# Altium footprint library ST封装.PcbLib: 1336 footprints (part 36 of 109)
Each footprint in its own frame and in the unit in brackets; x right, y up, seen from the top. Pads: shape width x height; smd on the part's side, far side on the other; paste and mask are expansions set on the pad; w line width, h text height; cw(c..) or ccw(c..) is an arc to the next point about the centre after c.
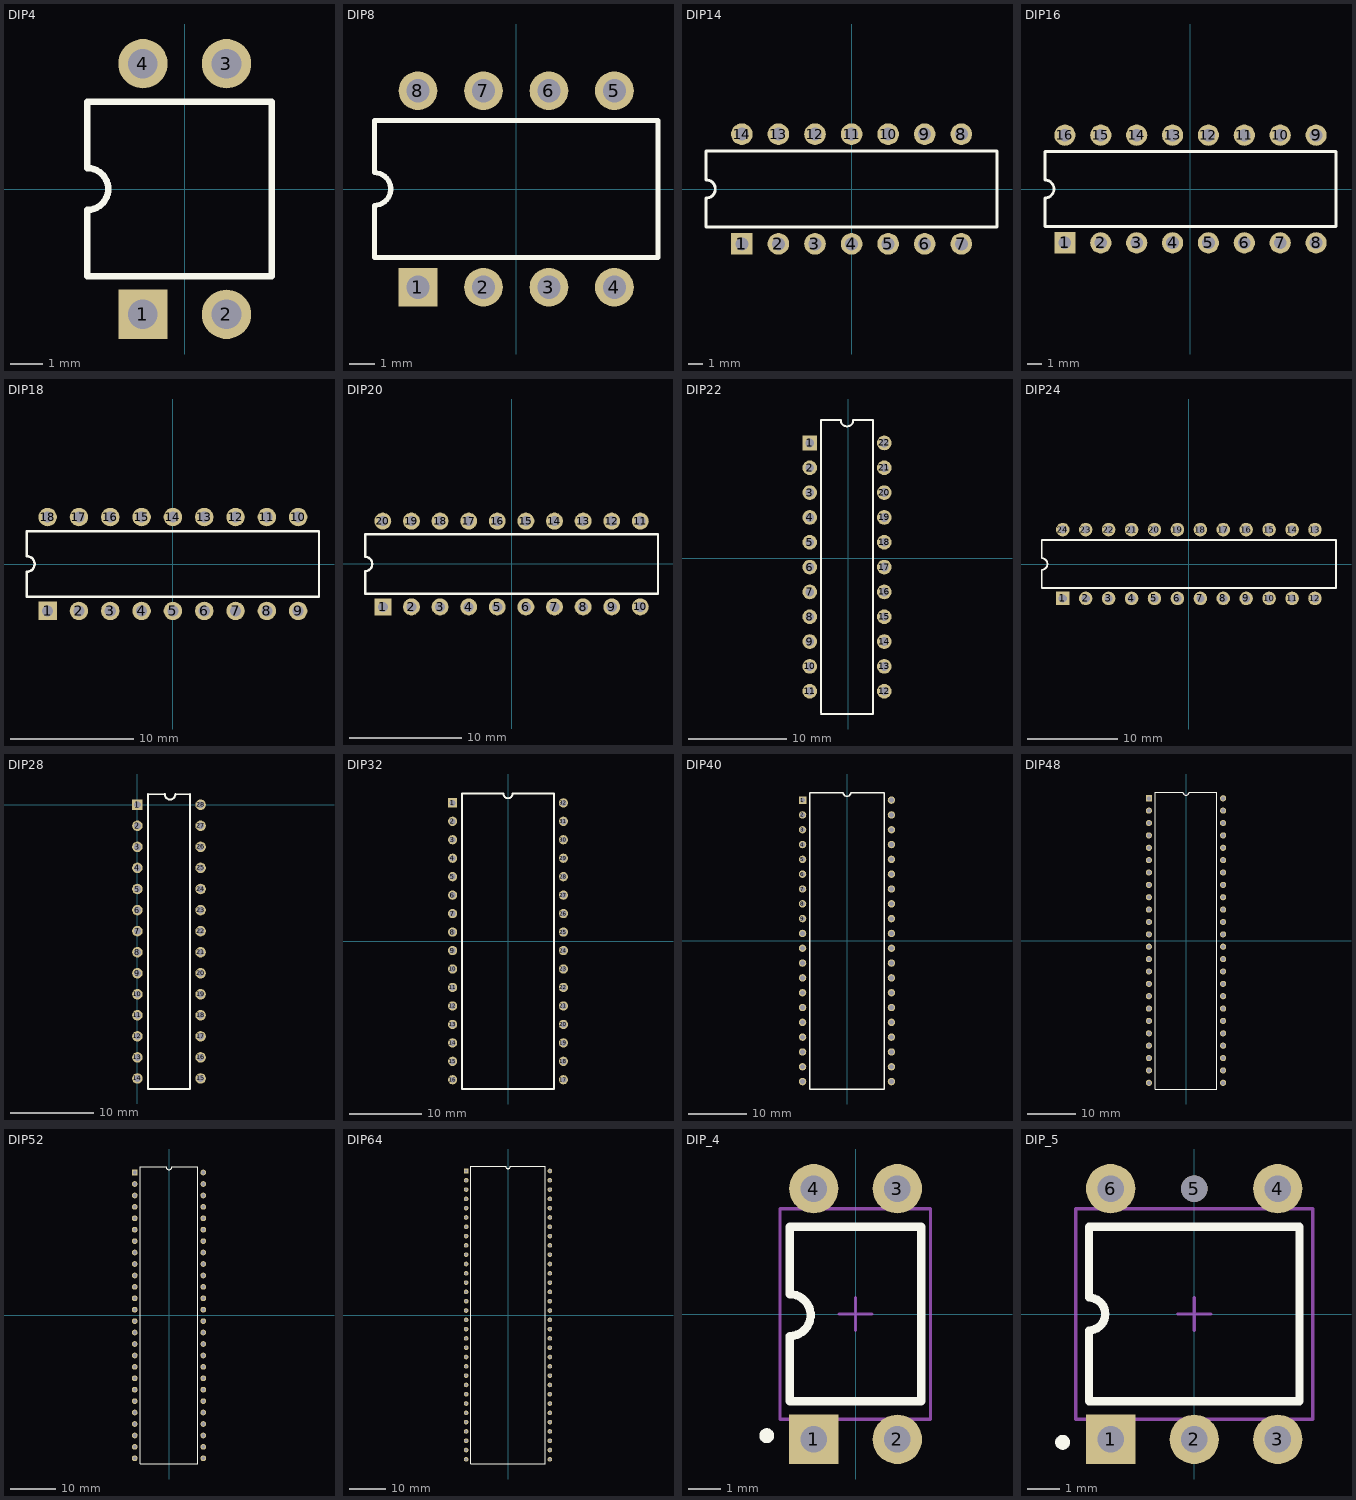
[diagram p35: the footprints below, top view; thin cyan lines are the x and y axes]

## DIP4 [mm] "DIP; 8 Leads; Row Spacing 7.62 mm; Pitch 2.54 mm"
height 5.08
pads (4):
  rect 1.5x1.5 hole 0.9: 1(-1.27,-3.81)
  round 1.5 hole 0.9: 2(1.27,-3.81) 3(1.27,3.81) 4(-1.27,3.81)
Top Overlay:
  lines w0.2: -2.96,-2.65 -2.96,-0.635 ccw(c-2.96,0) -2.96,0.635 -2.96,2.65 2.64,2.65 2.64,-2.65 -2.96,-2.65
3D body "DIP4.STEP": height 4.31, standoff -3.28, extent -2.88,-3.825 2.66,4.175

## DIP8 [mm] "DIP; 8 Leads; Row Spacing 7.62 mm; Pitch 2.54 mm"
height 5.08
pads (8):
  rect 1.5x1.5 hole 0.9: 1(-3.81,-3.81)
  round 1.5 hole 0.9: 2(-1.27,-3.81) 3(1.27,-3.81) 4(3.81,-3.81) 5(3.81,3.81) 6(1.27,3.81) 7(-1.27,3.81) 8(-3.81,3.81)
Top Overlay:
  lines w0.2: -5.5,-2.65 5.5,-2.65 5.5,2.65 -5.5,2.65 -5.5,0.635 cw(c-5.5,0) -5.5,-0.635 -5.5,-2.65
3D body "DIP8.STEP": height 4.5, standoff -3.5, extent -5.273,-3.753 5.527,4.007

## DIP14 [mm] "DIP; 14 Leads; Row Spacing 7.62 mm; Pitch 2.54 mm"
height 5.1
pads (14):
  rect 1.5x1.5 hole 0.9: 1(-7.62,-3.81)
  round 1.5 hole 0.9: 2(-5.08,-3.81) 3(-2.54,-3.81) 4(0,-3.81) 5(2.54,-3.81) 6(5.08,-3.81) 7(7.62,-3.81) 8(7.62,3.81) 9(5.08,3.81) 10(2.54,3.81) 11(0,3.81) 12(-2.54,3.81) 13(-5.08,3.81) 14(-7.62,3.81)
Top Overlay:
  lines w0.2: -10.1,-2.65 10.1,-2.65 10.1,2.65 -10.1,2.65 -10.1,0.635 cw(c-10.1,0) -10.1,-0.635 -10.1,-2.65
3D body "DIP14.STEP": height 4.57, standoff -3.81, extent -9.715,-3.91 9.715,3.91

## DIP16 [mm] "DIP; 16 Leads; Row Spacing 7.62 mm; Pitch 2.54 mm"
height 5.1
pads (16):
  rect 1.5x1.5 hole 0.9: 1(-8.89,-3.81)
  round 1.5 hole 0.9: 2(-6.35,-3.81) 3(-3.81,-3.81) 4(-1.27,-3.81) 5(1.27,-3.81) 6(3.81,-3.81) 7(6.35,-3.81) 8(8.89,-3.81) 9(8.89,3.81) 10(6.35,3.81) 11(3.81,3.81) 12(1.27,3.81) 13(-1.27,3.81) 14(-3.81,3.81) 15(-6.35,3.81) 16(-8.89,3.81)
Top Overlay:
  lines w0.2: -10.3,-2.65 10.3,-2.65 10.3,2.65 -10.3,2.65 -10.3,0.635 cw(c-10.3,0) -10.3,-0.635 -10.3,-2.65
3D body "DIP16.STEP": height 4.57, standoff -3.81, extent -9.74,-3.91 9.69,3.91

## DIP18 [mm] "DIP; 18 Leads; Row Spacing 7.62 mm; Pitch 2.54 mm"
height 3.93
pads (18):
  rect 1.5x1.5 hole 0.9: 1(-10.16,-3.81)
  round 1.5 hole 0.9: 2(-7.62,-3.81) 3(-5.08,-3.81) 4(-2.54,-3.81) 5(0,-3.81) 6(2.54,-3.81) 7(5.08,-3.81) 8(7.62,-3.81) 9(10.16,-3.81) 10(10.16,3.81) 11(7.62,3.81) 12(5.08,3.81) 13(2.54,3.81) 14(0,3.81) 15(-2.54,3.81) 16(-5.08,3.81) 17(-7.62,3.81) 18(-10.16,3.81)
Top Overlay:
  lines w0.2: -11.85,-2.65 11.85,-2.65 11.85,2.65 -11.85,2.65 -11.85,0.635 cw(c-11.85,0) -11.85,-0.635 -11.85,-2.65
3D body "DIP18.STEP": height 4.57, standoff -3.81, extent -11.62,-3.91 11.62,3.91

## DIP20 [mm] "DIP; 20 Leads; Row Spacing 7.62 mm; Pitch 2.54 mm"
height 3.93
pads (20):
  rect 1.5x1.5 hole 0.9: 1(-11.43,-3.81)
  round 1.5 hole 0.9: 2(-8.89,-3.81) 3(-6.35,-3.81) 4(-3.81,-3.81) 5(-1.27,-3.81) 6(1.27,-3.81) 7(3.81,-3.81) 8(6.35,-3.81) 9(8.89,-3.81) 10(11.43,-3.81) 11(11.43,3.81) 12(8.89,3.81) 13(6.35,3.81) 14(3.81,3.81) 15(1.27,3.81) 16(-1.27,3.81) 17(-3.81,3.81) 18(-6.35,3.81) 19(-8.89,3.81) 20(-11.43,3.81)
Top Overlay:
  lines w0.2: -13,-2.65 13,-2.65 13,2.65 -13,2.65 -13,0.635 cw(c-13,0) -13,-0.635 -13,-2.65
3D body "DIP-20pin.STEP": height 4.65, standoff -1.57, extent -12.764,-3.937 13.017,3.937

## DIP22 [mm]
pads (22):
  rect 1.5x1.5 hole 0.9: 1(-3.937,11.811)
  round 1.5 hole 0.9: 2(-3.937,9.271) 3(-3.937,6.731) 4(-3.937,4.191) 5(-3.937,1.651) 6(-3.937,-0.889) 7(-3.937,-3.429) 8(-3.937,-5.969) 9(-3.937,-8.509) 10(-3.937,-11.049) 11(-3.937,-13.589) 12(3.683,-13.589) 13(3.683,-11.049) 14(3.683,-8.509) 15(3.683,-5.969) 16(3.683,-3.429) 17(3.683,-0.889) 18(3.683,1.651) 19(3.683,4.191) 20(3.683,6.731) 21(3.683,9.271) 22(3.683,11.811)
Top Overlay:
  lines w0.2: -2.777,-15.919 2.523,-15.919 ; -2.777,-15.748 -2.777,14.141 -0.762,14.141 ccw(c-0.127,14.141) 0.508,14.141 2.523,14.141 2.523,-15.875
3D body "DIP-22pin.STEP": height 5.29, standoff -2.28, extent -4.062,-15.719 3.808,13.941

## DIP24 [mm] "DIP; 24 Leads; Row Spacing 7.62 mm; Pitch 2.54 mm"
height 4.32
pads (24):
  rect 1.5x1.5 hole 0.9: 1(-13.97,-3.81)
  round 1.5 hole 0.9: 2(-11.43,-3.81) 3(-8.89,-3.81) 4(-6.35,-3.81) 5(-3.81,-3.81) 6(-1.27,-3.81) 7(1.27,-3.81) 8(3.81,-3.81) 9(6.35,-3.81) 10(8.89,-3.81) 11(11.43,-3.81) 12(13.97,-3.81) 13(13.97,3.81) 14(11.43,3.81) 15(8.89,3.81) 16(6.35,3.81) 17(3.81,3.81) 18(1.27,3.81) 19(-1.27,3.81) 20(-3.81,3.81) 21(-6.35,3.81) 22(-8.89,3.81) 23(-11.43,3.81) 24(-13.97,3.81)
Top Overlay:
  lines w0.2: -16.3,-2.65 16.3,-2.65 16.3,2.65 -16.3,2.65 -16.3,0.635 cw(c-16.3,0) -16.3,-0.635 -16.3,-2.65
3D body "DIP24.STEP": height 4.57, standoff -3.81, extent -16.192,-4.037 15.938,3.783

## DIP28 [mil]
pads (28):
  rect 50x50 hole 32: 1(0,0)
  round 50 hole 32: 2(0,-100) 3(0,-200) 4(0,-300) 5(0,-400) 6(0,-500) 7(0,-600) 8(0,-700) 9(0,-800) 10(0,-900) 11(0,-1000) 12(0,-1100) 13(0,-1200) 14(0,-1300) 15(300,-1300) 16(300,-1200) 17(300,-1100) 18(300,-1000) 19(300,-900) 20(300,-800) 21(300,-700) 22(300,-600) 23(300,-500) 24(300,-400) 25(300,-300) 26(300,-200) 27(300,-100) 28(300,0)
Top Overlay:
  lines w8: 50,-1350 250,-1350 ; 50,50 130,50 ; 180,50 250,50
  lines w10: 50,-1350 50,50 ; 130,50 ccw(c155,50) 180,50 ; 250,-1350 250,50
3D body "DIP28.STEP": height 179.92, standoff -150, extent 1.06,-1334.96 308.94,44.97

## DIP32 [mil]
pads (32):
  rect 50x50 hole 32: 1(-300,750)
  round 50 hole 32: 2(-300,650) 3(-300,550) 4(-300,450) 5(-300,350) 6(-300,250) 7(-300,150) 8(-300,50) 9(-300,-50) 10(-300,-150) 11(-300,-250) 12(-300,-350) 13(-300,-450) 14(-300,-550) 15(-300,-650) 16(-300,-750) 17(300,-750) 18(300,-650) 19(300,-550) 20(300,-450) 21(300,-350) 22(300,-250) 23(300,-150) 24(300,-50) 25(300,50) 26(300,150) 27(300,250) 28(300,350) 29(300,450) 30(300,550) 31(300,650) 32(300,750)
Top Overlay:
  lines w10: -250,-800 -250,800 -25,800 ccw(c0,800) 25,800 250,800 250,-800 -250,-800

## DIP40 [mil]
pads (40):
  rect 50x50 hole 32: 1(-300,950)
  round 50 hole 32: 2(-300,850) 3(-300,750) 4(-300,650) 5(-300,550) 6(-300,450) 7(-300,350) 8(-300,250) 9(-300,150) 10(-300,50) 11(-300,-50) 12(-300,-150) 13(-300,-250) 14(-300,-350) 15(-300,-450) 16(-300,-550) 17(-300,-650) 18(-300,-750) 19(-300,-850) 20(-300,-950) 21(300,-950) 22(300,-850) 23(300,-750) 24(300,-650) 25(300,-550) 26(300,-450) 27(300,-350) 28(300,-250) 29(300,-150) 30(300,-50) 31(300,50) 32(300,150) 33(300,250) 34(300,350) 35(300,450) 36(300,550) 37(300,650) 38(300,750) 39(300,850) 40(300,950)
Top Overlay:
  lines w10: -250,-1000 250,-1000 250,1000 25,1000 cw(c0,1000) -25,1000 -250,1000 -250,-1000
3D body "DIP40.STEP": height 224.41, standoff -101.57, extent -312.6,-1034.25 297.24,1030.71

## DIP48 [mil]
pads (48):
  rect 50x50 hole 32: 1(-300,1150)
  round 50 hole 32: 2(-300,1050) 3(-300,950) 4(-300,850) 5(-300,750) 6(-300,650) 7(-300,550) 8(-300,450) 9(-300,350) 10(-300,250) 11(-300,150) 12(-300,50) 13(-300,-50) 14(-300,-150) 15(-300,-250) 16(-300,-350) 17(-300,-450) 18(-300,-550) 19(-300,-650) 20(-300,-750) 21(-300,-850) 22(-300,-950) 23(-300,-1050) 24(-300,-1150) 25(300,-1150) 26(300,-1050) 27(300,-950) 28(300,-850) 29(300,-750) 30(300,-650) 31(300,-550) 32(300,-450) 33(300,-350) 34(300,-250) 35(300,-150) 36(300,-50) 37(300,50) 38(300,150) 39(300,250) 40(300,350) 41(300,450) 42(300,550) 43(300,650) 44(300,750) 45(300,850) 46(300,950) 47(300,1050) 48(300,1150)
Top Overlay:
  lines w10: -250,-1200 250,-1200 250,1200 25,1200 cw(c0,1200) -25,1200 -250,1200 -250,-1200
3D body "DIP48.STEP": height 183.46, standoff -129.13, extent -302.95,-1208.86 312.01,1212.01

## DIP52 [mil]
pads (52):
  rect 50x50 hole 32: 1(-300,1250)
  round 50 hole 32: 2(-300,1150) 3(-300,1050) 4(-300,950) 5(-300,850) 6(-300,750) 7(-300,650) 8(-300,550) 9(-300,450) 10(-300,350) 11(-300,250) 12(-300,150) 13(-300,50) 14(-300,-50) 15(-300,-150) 16(-300,-250) 17(-300,-350) 18(-300,-450) 19(-300,-550) 20(-300,-650) 21(-300,-750) 22(-300,-850) 23(-300,-950) 24(-300,-1050) 25(-300,-1150) 26(-300,-1250) 27(300,-1250) 28(300,-1150) 29(300,-1050) 30(300,-950) 31(300,-850) 32(300,-750) 33(300,-650) 34(300,-550) 35(300,-450) 36(300,-350) 37(300,-250) 38(300,-150) 39(300,-50) 40(300,50) 41(300,150) 42(300,250) 43(300,350) 44(300,450) 45(300,550) 46(300,650) 47(300,750) 48(300,850) 49(300,950) 50(300,1050) 51(300,1150) 52(300,1250)
Top Overlay:
  lines w10: -250,-1300 250,-1300 250,1300 25,1300 cw(c0,1300) -25,1300 -250,1300 -250,-1300

## DIP64 [mil]
pads (64):
  rect 50x50 hole 32: 1(-450,1550)
  round 50 hole 32: 2(-450,1450) 3(-450,1350) 4(-450,1250) 5(-450,1150) 6(-450,1050) 7(-450,950) 8(-450,850) 9(-450,750) 10(-450,650) 11(-450,550) 12(-450,450) 13(-450,350) 14(-450,250) 15(-450,150) 16(-450,50) 17(-450,-50) 18(-450,-150) 19(-450,-250) 20(-450,-350) 21(-450,-450) 22(-450,-550) 23(-450,-650) 24(-450,-750) 25(-450,-850) 26(-450,-950) 27(-450,-1050) 28(-450,-1150) 29(-450,-1250) 30(-450,-1350) 31(-450,-1450) 32(-450,-1550) 33(450,-1550) 34(450,-1450) 35(450,-1350) 36(450,-1250) 37(450,-1150) 38(450,-1050) 39(450,-950) 40(450,-850) 41(450,-750) 42(450,-650) 43(450,-550) 44(450,-450) 45(450,-350) 46(450,-250) 47(450,-150) 48(450,-50) 49(450,50) 50(450,150) 51(450,250) 52(450,350) 53(450,450) 54(450,550) 55(450,650) 56(450,750) 57(450,850) 58(450,950) 59(450,1050) 60(450,1150) 61(450,1250) 62(450,1350) 63(450,1450) 64(450,1550)
Top Overlay:
  lines w10: -400,-1600 400,-1600 400,1600 25,1600 cw(c0,1600) -25,1600 -400,1600 -400,-1600

## DIP_4 [mm] "7.62"
pads (4):
  rect 1.5x1.5 hole 0.8: 1(-1.27,-3.81)
  round 1.5 hole 0.8: 2(1.27,-3.81) 3(1.27,3.81) 4(-1.27,3.81)
Top Overlay:
  circle w0.254: c-2.7,-3.7 r0.1
  lines w0.254: -2,-0.7 -2,-2.65 2,-2.65 2,2.65 -2,2.65 -2,0.6 cw(c-2,-0.035) -2,-0.67
Mechanical 15:
  lines w0.1: -0.5,0 0.5,0 ; 0,-0.5 0,0.5 ; -2.3,-3.2 2.28,-3.2 2.28,3.2 -2.3,3.2 -2.3,-3.2
3D body "DIP4.step": height 4.5, standoff -2.8, extent -2.3,-3.935 2.28,3.935

## DIP_5 [mm] "7.62"
pads (6):
  rect 1.5x1.5 hole 0.8: 1(-2.54,-3.81)
  round 1.5 hole 0.8: 2(0,-3.81) 3(2.54,-3.81) 4(2.54,3.81) 6(-2.54,3.81)
  round 0.8 hole 0.8 unplated: 5(0,3.81)
Top Overlay:
  circle w0.254: c-4,-3.9 r0.1
  lines w0.254: -3.2,-2.65 -3.2,-0.5 ccw(c-3.204,0) -3.2,0.5 -3.2,2.65 3.2,2.65 3.2,-2.65 -3.2,-2.65
Mechanical 15:
  lines w0.1: -0.5,0 0.5,0 ; 0,-0.5 0,0.5 ; -3.6,-3.2 3.6,-3.2 3.6,3.2 -3.6,3.2 -3.6,-3.2
3D body "DIP6-1.STEP": height 4.5, standoff -2.8, extent -3.56,-4 3.56,3.87